# Altium footprint library SVP_Shared.PcbLib: 57 footprints (part 4 of 4)
Each footprint in its own frame and in the unit in brackets; x right, y up, seen from the top. Pads: shape width x height; smd on the part's side, far side on the other; paste and mask are expansions set on the pad; w line width, h text height; cw(c..) or ccw(c..) is an arc to the next point about the centre after c.
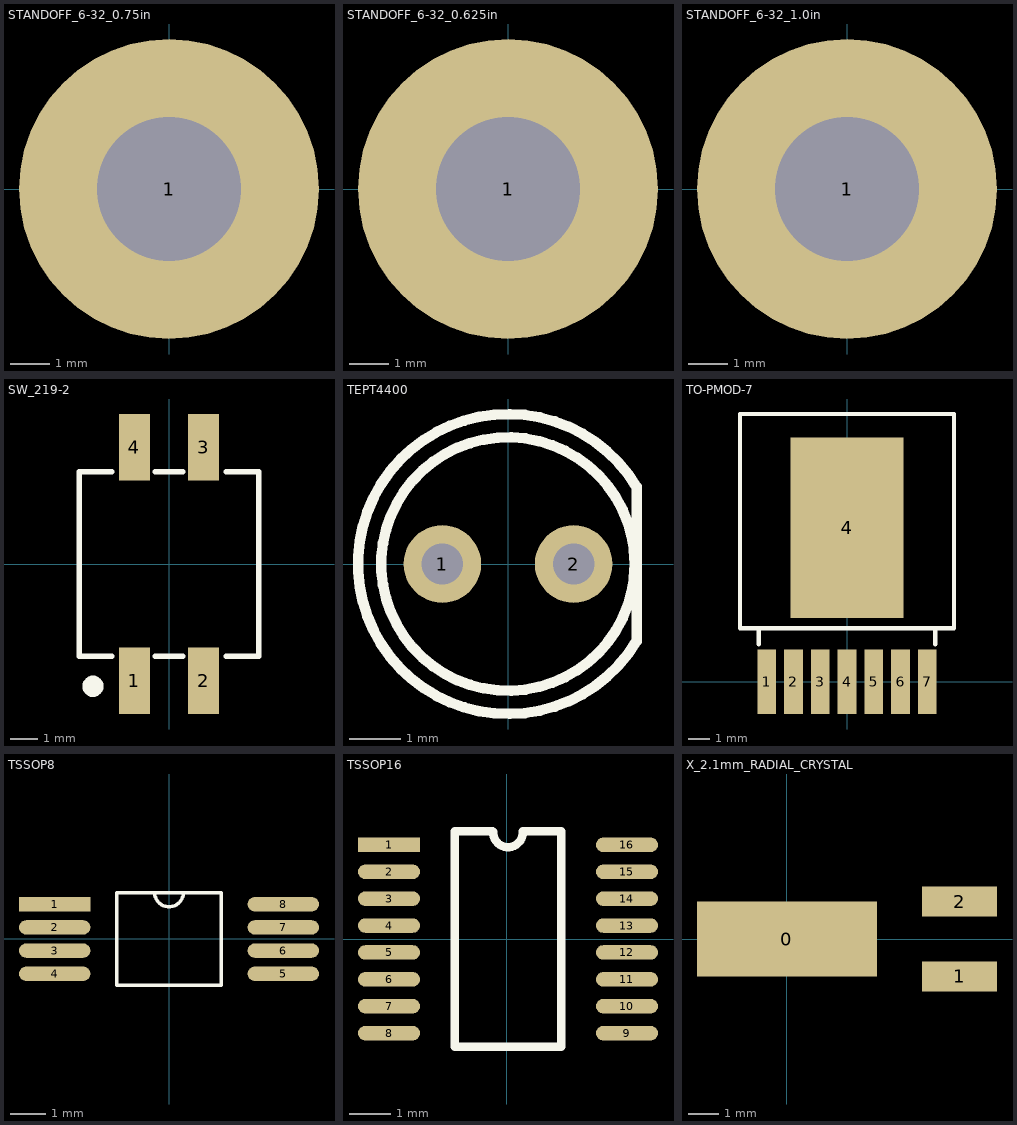
[diagram p3: the footprints below, top view; thin cyan lines are the x and y axes]

## STANDOFF_6-32_0.75in [mil] "Standoff for 6-32 screw, 0.75 inches tall"
height 750
pads (1):
  round 300 hole 144 paste+0: 1(0,0)
3D body "91780A131_ALUM FEM THRDED HEX STANDOFF.STEP": height 750.5, standoff 0.5, extent -124.99,-144.33 125.01,144.34
3D body "91274A008_COATED ALLOY STEEL SOCKET HEAD CAP SCREW.STEP": height 138.5, standoff -374.5, extent -112.99,-112.99 113.01,113

## STANDOFF_6-32_0.625in [mil] "Standoff for 6-32 screw, 0.625 inches tall"
height 625
pads (1):
  round 300 hole 144 paste+0: 1(0,0)
3D body "91780A129_ALUM FEM THRDED HEX STANDOFF.STEP": height 625.5, standoff 0.5, extent -124.99,-144.33 125.01,144.34
3D body "91274A008_COATED ALLOY STEEL SOCKET HEAD CAP SCREW.STEP": height 138.5, standoff -374.5, extent -112.99,-112.99 113.01,113

## STANDOFF_6-32_1.0in [mil] "Standoff for 6-32 screw, 1.0 inches tall"
height 1000
pads (1):
  round 300 hole 144 paste+0: 1(0,0)
3D body "91274A008_COATED ALLOY STEEL SOCKET HEAD CAP SCREW.STEP": height 138.5, standoff -374.5, extent -112.99,-112.99 113.01,113
3D body "91780A133_ALUM FEM THRDED HEX STANDOFF.STEP": height 1000.5, standoff 0.5, extent -124.99,-144.33 125.01,144.34

## SW_219-2 [mm] "SWITCH TAPE SEAL 2 POS SMD 50V"
pads (4):
  rect 1.13x2.44 smd: 1(-1.27,-4.3) 2(1.27,-4.3) 3(1.27,4.3) 4(-1.27,4.3)
Top Overlay:
  circle w0.5: c-2.8,-4.5 r0.141
  lines w0.203: -2.1,-3.4 -3.3,-3.4 -3.3,3.4 -2.1,3.4 ; -0.5,-3.4 0.5,-3.4 ; -0.5,3.4 0.5,3.4 ; 2.1,-3.4 3.3,-3.4 3.3,3.4 2.1,3.4
3D body: height 3.8, standoff 0.25, extent -3.3,-3.4 3.3,3.4

## TEPT4400 [mm]
pads (2):
  round 1.5 hole 0.8: 1(-1.27,0) 2(1.27,0)
Top Overlay:
  circle w0.203: c0,0 r2.45
  lines w0.203: 2.487,-1.492 cw(c0,0) 2.487,1.492 2.487,-1.492
3D body: height 9.1, standoff 4.8, extent -2.5,-2.499 2.5,2.499
3D body: height 4.8, standoff 3.8, extent -2.9,-2.899 2.9,2.899
3D body: height 3.8, standoff -4.5, extent -1.549,-0.152 -0.991,0.152
3D body: height 3.8, standoff -2, extent 0.991,-0.152 1.549,0.152

## TO-PMOD-7 [mm] "7-pin TO-PMOD SMD Package"
pads (8):
  rect 0.89x3.06 smd: 1(-3.81,0) 2(-2.54,0) 3(-1.27,0) 4(0,0) 5(1.27,0) 6(2.54,0) 7(3.81,0)
  rect 5.35x8.54 smd: 4(0,7.305)
Top Overlay:
  lines w0.203: -4.191,1.778 -4.191,2.54 ; 4.191,1.778 4.191,2.54 ; -5.08,2.54 -5.08,12.7 5.08,12.7 5.08,2.54 -5.08,2.54
3D body "User Library-TO-PMOD-7-1.step": height 4.57, standoff 0, extent -5.08,-1.23 5.08,12.545

## TSSOP8 [mm]
pads (8):
  rect 2x0.4 smd: 1(-3.2,0.975)
  oval 2x0.4 smd: 2(-3.2,0.325) 3(-3.2,-0.325) 4(-3.2,-0.975) 5(3.2,-0.975) 6(3.2,-0.325) 7(3.2,0.325) 8(3.2,0.975)
Top Overlay:
  lines w0.1: -0.4,1.3 ccw(c0,1.3) 0.4,1.3 ; -1.465,-1.3 -1.465,1.3 1.465,1.3 1.465,-1.3 -1.465,-1.3
3D body "User Library-TSS0P8-1.step": height 1.09, standoff 0, extent -3.125,-1.5 3.155,1.5

## TSSOP16 [mm]
pads (16):
  rect 1.5x0.35 smd: 1(-2.85,2.275)
  oval 1.5x0.35 smd: 2(-2.85,1.625) 3(-2.85,0.975) 4(-2.85,0.325) 5(-2.85,-0.325) 6(-2.85,-0.975) 7(-2.85,-1.625) 8(-2.85,-2.275) 9(2.9,-2.275) 10(2.9,-1.625) 11(2.9,-0.975) 12(2.9,-0.325) 13(2.9,0.325) 14(2.9,0.975) 15(2.9,1.625) 16(2.9,2.275)
Top Overlay:
  lines w0.203: -0.35,2.6 -1.262,2.6 -1.262,-2.6 1.312,-2.6 1.312,2.6 0.4,2.6 ; -0.331,2.596 ccw(c0.025,2.575) 0.381,2.601
3D body "User Library-tssop16-2.step": height 1.2, standoff 0, extent -3.2,-2.55 3.2,2.55

## X_2.1mm_RADIAL_CRYSTAL [mm] "2.1mm radial crystal"
pads (3):
  rect 6x2.5 smd: 0(0,0)
  rect 2.5x1 smd: 1(5.75,-1.25) 2(5.75,1.25)
3D body "User Library-AB26TRB.step": height 2, standoff 0, extent -2.5,-1.4 6.5,1.4